# Altium footprint library 排针-排母-1.27.PcbLib: 152 footprints (part 10 of 10)
Each footprint in its own frame and in the unit in brackets; x right, y up, seen from the top. Pads: shape width x height; smd on the part's side, far side on the other; paste and mask are expansions set on the pad; w line width, h text height; cw(c..) or ccw(c..) is an arc to the next point about the centre after c.
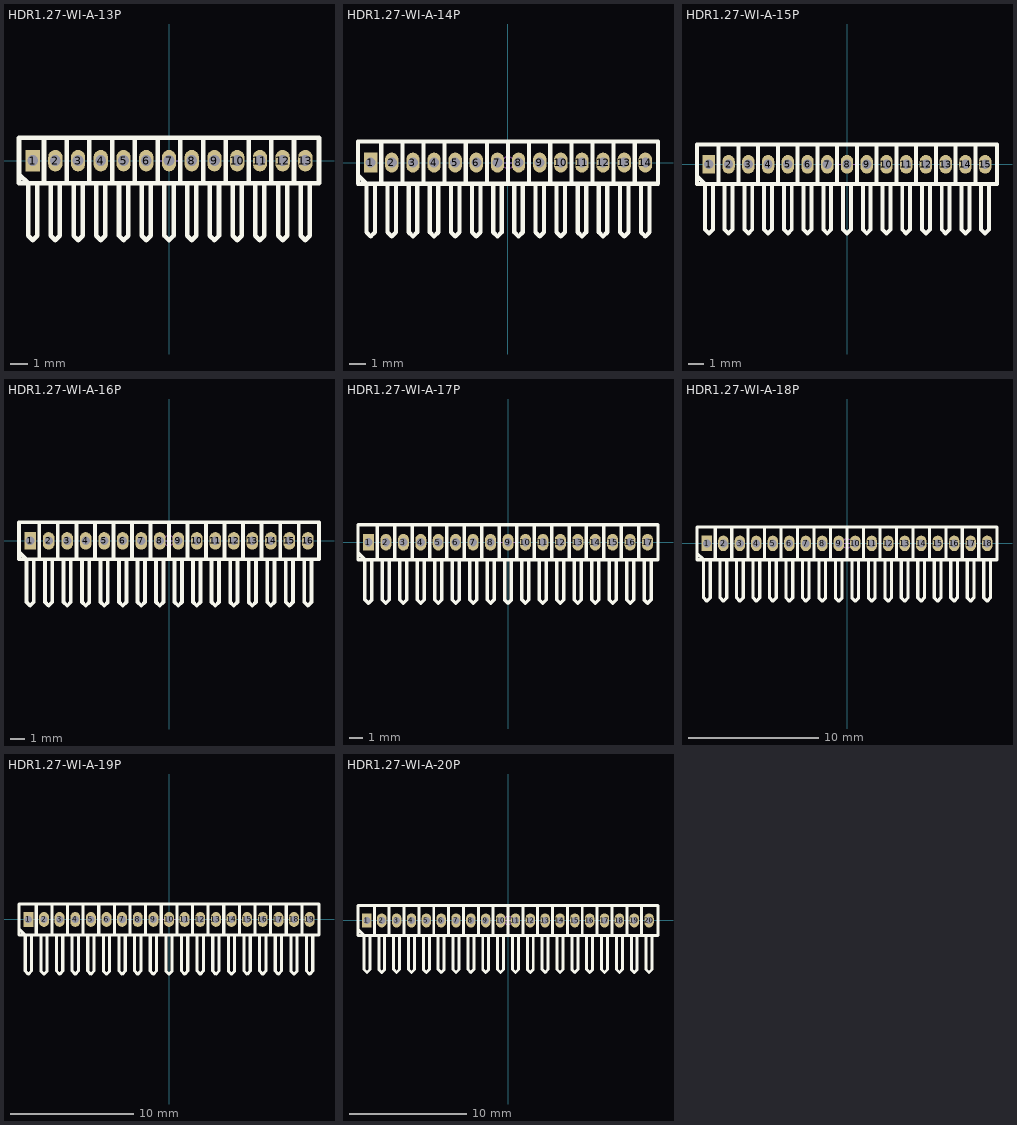
[diagram p9: the footprints below, top view; thin cyan lines are the x and y axes]

## HDR1.27-WI-A-13P [mm] "直插，脚距：1.27mm"
pads (13):
  rect 0.8x1.2 hole 0.6: 1(-7.62,0)
  oval 0.8x1.2 hole 0.6: 2(-6.35,0) 3(-5.08,0) 4(-3.81,0) 5(-2.54,0) 6(-1.27,0) 7(0,0) 8(1.27,0) 9(2.54,0) 10(3.81,0) 11(5.08,0) 12(6.35,0) 13(7.62,0)
Top Overlay:
  lines w0.254: -8.382,-0.762 -7.874,-1.27 ; -7.874,-1.397 -7.874,-4.191 -7.62,-4.445 -7.366,-4.191 -7.366,-1.27 ; -6.985,-1.27 -6.985,1.27 ; -6.604,-1.397 -6.604,-4.191 -6.35,-4.445 -6.096,-4.191 -6.096,-1.27 ; -5.715,-1.27 -5.715,1.2 ; -5.334,-1.397 -5.334,-4.191 -5.08,-4.445 -4.826,-4.191 -4.826,-1.27 ; -4.445,-1.2 -4.445,1.27 ; -4.064,-1.397 -4.064,-4.191 -3.81,-4.445 -3.556,-4.191 -3.556,-1.27 ; -3.175,1.27 -3.175,-1.235 ; -2.794,-1.397 -2.794,-4.191 -2.54,-4.445 -2.286,-4.191 -2.286,-1.27 ; -1.905,-1.235 -1.905,1.27 ; -1.524,-1.397 -1.524,-4.191 -1.27,-4.445 -1.016,-4.191 -1.016,-1.27 ; -0.635,-1.235 -0.635,1.27 ; -0.254,-1.397 -0.254,-4.191 0,-4.445 0.254,-4.191 0.254,-1.27 ; 0.635,-1.235 0.635,1.27 ; 1.016,-1.397 1.016,-4.191 1.27,-4.445 1.524,-4.191 1.524,-1.27 ; 1.905,-1.235 1.905,1.27 ; 2.286,-1.397 2.286,-4.191 2.54,-4.445 2.794,-4.191 2.794,-1.27 ; 3.175,-1.235 3.175,1.27 ; 3.556,-1.397 3.556,-4.191 3.81,-4.445 4.064,-4.191 4.064,-1.27 ; 4.445,-1.235 4.445,1.27 ; 4.826,-1.397 4.826,-4.191 5.08,-4.445 5.334,-4.191 5.334,-1.27 ; 5.715,-1.235 5.715,1.27 ; 6.096,-1.397 6.096,-4.191 6.35,-4.445 6.604,-4.191 6.604,-1.27 ; 6.985,-1.235 6.985,1.27 ; 7.366,-1.397 7.366,-4.191 7.62,-4.445 7.874,-4.191 7.874,-1.27 ; -3.175,-1.235 -3.175,-1.235 ; -8.382,-1.27 8.382,-1.27 8.382,1.27 -8.382,1.27 -8.382,-1.27
Mechanical 15:
  circle w0.05: c0,0 r0.35
  lines w0.05: -0.5,0 0.5,0 ; 0,-0.5 0,0.5
3D body: height 3.96, standoff -2.72, extent -8.255,-4.7 8.255,1.2

## HDR1.27-WI-A-14P [mm] "直插，脚距：1.27mm"
pads (14):
  rect 0.8x1.2 hole 0.6: 1(-8.255,0)
  oval 0.8x1.2 hole 0.6: 2(-6.985,0) 3(-5.715,0) 4(-4.445,0) 5(-3.175,0) 6(-1.905,0) 7(-0.635,0) 8(0.635,0) 9(1.905,0) 10(3.175,0) 11(4.445,0) 12(5.715,0) 13(6.985,0) 14(8.255,0)
Top Overlay:
  lines w0.254: -9.017,-0.762 -8.509,-1.27 ; -8.509,-1.397 -8.509,-4.191 -8.255,-4.445 -8.001,-4.191 -8.001,-1.27 ; -7.62,-1.27 -7.62,1.27 ; -7.239,-1.397 -7.239,-4.191 -6.985,-4.445 -6.731,-4.191 -6.731,-1.27 ; -6.35,-1.27 -6.35,1.2 ; -5.969,-1.397 -5.969,-4.191 -5.715,-4.445 -5.461,-4.191 -5.461,-1.27 ; -5.08,-1.2 -5.08,1.27 ; -4.699,-1.397 -4.699,-4.191 -4.445,-4.445 -4.191,-4.191 -4.191,-1.27 ; -3.81,1.27 -3.81,-1.235 ; -3.429,-1.397 -3.429,-4.191 -3.175,-4.445 -2.921,-4.191 -2.921,-1.27 ; -2.54,-1.235 -2.54,1.27 ; -2.159,-1.397 -2.159,-4.191 -1.905,-4.445 -1.651,-4.191 -1.651,-1.27 ; -1.27,-1.235 -1.27,1.27 ; -0.889,-1.397 -0.889,-4.191 -0.635,-4.445 -0.381,-4.191 -0.381,-1.27 ; 0,-1.235 0,1.27 ; 0.381,-1.397 0.381,-4.191 0.635,-4.445 0.889,-4.191 0.889,-1.27 ; 1.27,-1.235 1.27,1.27 ; 1.651,-1.397 1.651,-4.191 1.905,-4.445 2.159,-4.191 2.159,-1.27 ; 2.54,-1.235 2.54,1.27 ; 2.921,-1.397 2.921,-4.191 3.175,-4.445 3.429,-4.191 3.429,-1.27 ; 3.81,-1.235 3.81,1.27 ; 4.191,-1.397 4.191,-4.191 4.445,-4.445 4.699,-4.191 4.699,-1.27 ; 5.08,-1.235 5.08,1.27 ; 5.461,-1.397 5.461,-4.191 5.715,-4.445 5.969,-4.191 5.969,-1.27 ; 6.35,-1.235 6.35,1.27 ; 6.731,-1.397 6.731,-4.191 6.985,-4.445 7.239,-4.191 7.239,-1.27 ; 7.62,-1.235 7.62,1.27 ; 8.001,-1.397 8.001,-4.191 8.255,-4.445 8.509,-4.191 8.509,-1.27 ; -3.81,-1.235 -3.81,-1.235 ; -9.017,-1.27 -9.017,1.27 9.017,1.27 9.017,-1.27 -9.017,-1.27
Mechanical 15:
  circle w0.05: c0,0 r0.35
  lines w0.05: -0.5,0 0.5,0 ; 0,-0.5 0,0.5
3D body: height 3.96, standoff -2.72, extent -8.89,-4.7 8.89,1.2

## HDR1.27-WI-A-15P [mm] "直插，脚距：1.27mm"
pads (15):
  rect 0.8x1.2 hole 0.6: 1(-8.89,-0.017)
  oval 0.8x1.2 hole 0.6: 2(-7.62,-0.017) 3(-6.35,-0.017) 4(-5.08,-0.017) 5(-3.81,-0.017) 6(-2.54,-0.017) 7(-1.27,-0.017) 8(0,-0.017) 9(1.27,-0.017) 10(2.54,-0.017) 11(3.81,-0.017) 12(5.08,-0.017) 13(6.35,-0.017) 14(7.62,-0.017) 15(8.89,-0.017)
Top Overlay:
  lines w0.254: -9.652,-0.779 -9.144,-1.287 ; -9.144,-1.414 -9.144,-4.208 -8.89,-4.462 -8.636,-4.208 -8.636,-1.287 ; -8.255,-1.287 -8.255,1.253 ; -7.874,-1.414 -7.874,-4.208 -7.62,-4.462 -7.366,-4.208 -7.366,-1.287 ; -6.985,-1.287 -6.985,1.183 ; -6.604,-1.414 -6.604,-4.208 -6.35,-4.462 -6.096,-4.208 -6.096,-1.287 ; -5.715,-1.217 -5.715,1.253 ; -5.334,-1.414 -5.334,-4.208 -5.08,-4.462 -4.826,-4.208 -4.826,-1.287 ; -4.445,1.253 -4.445,-1.252 ; -4.064,-1.414 -4.064,-4.208 -3.81,-4.462 -3.556,-4.208 -3.556,-1.287 ; -3.175,-1.252 -3.175,1.253 ; -2.794,-1.414 -2.794,-4.208 -2.54,-4.462 -2.286,-4.208 -2.286,-1.287 ; -1.905,-1.252 -1.905,1.253 ; -1.524,-1.414 -1.524,-4.208 -1.27,-4.462 -1.016,-4.208 -1.016,-1.287 ; -0.635,-1.252 -0.635,1.253 ; -0.254,-1.414 -0.254,-4.208 0,-4.462 0.254,-4.208 0.254,-1.287 ; 0.635,-1.252 0.635,1.253 ; 1.016,-1.414 1.016,-4.208 1.27,-4.462 1.524,-4.208 1.524,-1.287 ; 1.905,-1.252 1.905,1.253 ; 2.286,-1.414 2.286,-4.208 2.54,-4.462 2.794,-4.208 2.794,-1.287 ; 3.175,-1.252 3.175,1.253 ; 3.556,-1.414 3.556,-4.208 3.81,-4.462 4.064,-4.208 4.064,-1.287 ; 4.445,-1.252 4.445,1.253 ; 4.826,-1.414 4.826,-4.208 5.08,-4.462 5.334,-4.208 5.334,-1.287 ; 5.715,-1.252 5.715,1.253 ; 6.096,-1.414 6.096,-4.208 6.35,-4.462 6.604,-4.208 6.604,-1.287 ; 6.985,-1.252 6.985,1.253 ; 7.366,-1.414 7.366,-4.208 7.62,-4.462 7.874,-4.208 7.874,-1.287 ; 8.255,-1.252 8.255,1.253 ; 8.636,-1.414 8.636,-4.208 8.89,-4.462 9.144,-4.208 9.144,-1.287 ; -4.445,-1.252 -4.445,-1.253 ; -9.652,-1.287 -9.652,1.253 9.652,1.253 9.652,-1.287 -9.652,-1.287
Mechanical 15:
  circle w0.05: c0,0 r0.35
  lines w0.05: -0.5,0 0.5,0 ; 0,-0.5 0,0.5
3D body: height 3.96, standoff -2.72, extent -9.525,-4.7 9.525,1.2

## HDR1.27-WI-A-16P [mm] "直插，脚距：1.27mm"
pads (16):
  rect 0.8x1.2 hole 0.6: 1(-9.525,-0.017)
  oval 0.8x1.2 hole 0.6: 2(-8.255,-0.017) 3(-6.985,-0.017) 4(-5.715,-0.017) 5(-4.445,-0.017) 6(-3.175,-0.017) 7(-1.905,-0.017) 8(-0.635,-0.017) 9(0.635,-0.017) 10(1.905,-0.017) 11(3.175,-0.017) 12(4.445,-0.017) 13(5.715,-0.017) 14(6.985,-0.017) 15(8.255,-0.017) 16(9.525,-0.017)
Top Overlay:
  lines w0.254: -10.287,-0.779 -9.779,-1.287 ; -9.779,-1.414 -9.779,-4.208 -9.525,-4.462 -9.271,-4.208 -9.271,-1.287 ; -8.89,-1.287 -8.89,1.253 ; -8.509,-1.414 -8.509,-4.208 -8.255,-4.462 -8.001,-4.208 -8.001,-1.287 ; -7.62,-1.287 -7.62,1.183 ; -7.239,-1.414 -7.239,-4.208 -6.985,-4.462 -6.731,-4.208 -6.731,-1.287 ; -6.35,-1.217 -6.35,1.253 ; -5.969,-1.414 -5.969,-4.208 -5.715,-4.462 -5.461,-4.208 -5.461,-1.287 ; -5.08,1.253 -5.08,-1.253 ; -4.699,-1.414 -4.699,-4.208 -4.445,-4.462 -4.191,-4.208 -4.191,-1.287 ; -3.81,-1.253 -3.81,1.253 ; -3.429,-1.414 -3.429,-4.208 -3.175,-4.462 -2.921,-4.208 -2.921,-1.287 ; -2.54,-1.253 -2.54,1.253 ; -2.159,-1.414 -2.159,-4.208 -1.905,-4.462 -1.651,-4.208 -1.651,-1.287 ; -1.27,-1.253 -1.27,1.253 ; -0.889,-1.414 -0.889,-4.208 -0.635,-4.462 -0.381,-4.208 -0.381,-1.287 ; 0,-1.253 0,1.253 ; 0.381,-1.414 0.381,-4.208 0.635,-4.462 0.889,-4.208 0.889,-1.287 ; 1.27,-1.253 1.27,1.253 ; 1.651,-1.414 1.651,-4.208 1.905,-4.462 2.159,-4.208 2.159,-1.287 ; 2.54,-1.253 2.54,1.253 ; 2.921,-1.414 2.921,-4.208 3.175,-4.462 3.429,-4.208 3.429,-1.287 ; 3.81,-1.253 3.81,1.253 ; 4.191,-1.414 4.191,-4.208 4.445,-4.462 4.699,-4.208 4.699,-1.287 ; 5.08,-1.253 5.08,1.253 ; 5.461,-1.414 5.461,-4.208 5.715,-4.462 5.969,-4.208 5.969,-1.287 ; 6.35,-1.253 6.35,1.253 ; 6.731,-1.414 6.731,-4.208 6.985,-4.462 7.239,-4.208 7.239,-1.287 ; 7.62,-1.253 7.62,1.253 ; 8.001,-1.414 8.001,-4.208 8.255,-4.462 8.509,-4.208 8.509,-1.287 ; 8.89,-1.253 8.89,1.253 ; 9.271,-1.414 9.271,-4.208 9.525,-4.462 9.779,-4.208 9.779,-1.287 ; -5.08,-1.253 -5.08,-1.253 ; -10.287,-1.287 -10.287,1.253 10.287,1.253 10.287,-1.287 -10.287,-1.287
Mechanical 15:
  circle w0.05: c0,0 r0.35
  lines w0.05: -0.5,0 0.5,0 ; 0,-0.5 0,0.5
3D body: height 3.96, standoff -2.72, extent -10.16,-4.7 10.16,1.2

## HDR1.27-WI-A-17P [mm] "直插，脚距：1.27mm"
pads (17):
  rect 0.8x1.2 hole 0.6: 1(-10.16,0)
  oval 0.8x1.2 hole 0.6: 2(-8.89,0) 3(-7.62,0) 4(-6.35,0) 5(-5.08,0) 6(-3.81,0) 7(-2.54,0) 8(-1.27,0) 9(0,0) 10(1.27,0) 11(2.54,0) 12(3.81,0) 13(5.08,0) 14(6.35,0) 15(7.62,0) 16(8.89,0) 17(10.16,0)
Top Overlay:
  lines w0.254: -10.922,-0.762 -10.414,-1.27 ; -10.414,-1.397 -10.414,-4.191 -10.16,-4.445 -9.906,-4.191 -9.906,-1.27 ; -9.525,-1.27 -9.525,1.27 ; -9.144,-1.397 -9.144,-4.191 -8.89,-4.445 -8.636,-4.191 -8.636,-1.27 ; -8.255,-1.27 -8.255,1.2 ; -7.874,-1.397 -7.874,-4.191 -7.62,-4.445 -7.366,-4.191 -7.366,-1.27 ; -6.985,-1.2 -6.985,1.27 ; -6.604,-1.397 -6.604,-4.191 -6.35,-4.445 -6.096,-4.191 -6.096,-1.27 ; -5.715,1.27 -5.715,-1.235 ; -5.334,-1.397 -5.334,-4.191 -5.08,-4.445 -4.826,-4.191 -4.826,-1.27 ; -4.445,-1.235 -4.445,1.27 ; -4.064,-1.397 -4.064,-4.191 -3.81,-4.445 -3.556,-4.191 -3.556,-1.27 ; -3.175,-1.235 -3.175,1.27 ; -2.794,-1.397 -2.794,-4.191 -2.54,-4.445 -2.286,-4.191 -2.286,-1.27 ; -1.905,-1.235 -1.905,1.27 ; -1.524,-1.397 -1.524,-4.191 -1.27,-4.445 -1.016,-4.191 -1.016,-1.27 ; -0.635,-1.235 -0.635,1.27 ; -0.254,-1.397 -0.254,-4.191 0,-4.445 0.254,-4.191 0.254,-1.27 ; 0.635,-1.235 0.635,1.27 ; 1.016,-1.397 1.016,-4.191 1.27,-4.445 1.524,-4.191 1.524,-1.27 ; 1.905,-1.235 1.905,1.27 ; 2.286,-1.397 2.286,-4.191 2.54,-4.445 2.794,-4.191 2.794,-1.27 ; 3.175,-1.235 3.175,1.27 ; 3.556,-1.397 3.556,-4.191 3.81,-4.445 4.064,-4.191 4.064,-1.27 ; 4.445,-1.235 4.445,1.27 ; 4.826,-1.397 4.826,-4.191 5.08,-4.445 5.334,-4.191 5.334,-1.27 ; 5.715,-1.235 5.715,1.27 ; 6.096,-1.397 6.096,-4.191 6.35,-4.445 6.604,-4.191 6.604,-1.27 ; 6.985,-1.235 6.985,1.27 ; 7.366,-1.397 7.366,-4.191 7.62,-4.445 7.874,-4.191 7.874,-1.27 ; 8.255,-1.235 8.255,1.27 ; 8.636,-1.397 8.636,-4.191 8.89,-4.445 9.144,-4.191 9.144,-1.27 ; 9.525,-1.235 9.525,1.27 ; 9.906,-1.397 9.906,-4.191 10.16,-4.445 10.414,-4.191 10.414,-1.27 ; -5.715,-1.235 -5.715,-1.235 ; -10.922,-1.27 -10.922,1.27 10.922,1.27 10.922,-1.27 -10.922,-1.27
Mechanical 15:
  circle w0.05: c0,0 r0.35
  lines w0.05: -0.5,0 0.5,0 ; 0,-0.5 0,0.5
3D body: height 3.96, standoff -2.72, extent -10.795,-4.7 10.795,1.2

## HDR1.27-WI-A-18P [mm] "直插，脚距：1.27mm"
pads (18):
  rect 0.8x1.2 hole 0.6: 1(-10.795,0)
  oval 0.8x1.2 hole 0.6: 2(-9.525,0) 3(-8.255,0) 4(-6.985,0) 5(-5.715,0) 6(-4.445,0) 7(-3.175,0) 8(-1.905,0) 9(-0.635,0) 10(0.635,0) 11(1.905,0) 12(3.175,0) 13(4.445,0) 14(5.715,0) 15(6.985,0) 16(8.255,0) 17(9.525,0) 18(10.795,0)
Top Overlay:
  lines w0.254: -11.557,-0.762 -11.049,-1.27 ; -11.049,-1.397 -11.049,-4.191 -10.795,-4.445 -10.541,-4.191 -10.541,-1.27 ; -10.16,-1.27 -10.16,1.27 ; -9.779,-1.397 -9.779,-4.191 -9.525,-4.445 -9.271,-4.191 -9.271,-1.27 ; -8.89,-1.27 -8.89,1.2 ; -8.509,-1.397 -8.509,-4.191 -8.255,-4.445 -8.001,-4.191 -8.001,-1.27 ; -7.62,-1.2 -7.62,1.27 ; -7.239,-1.397 -7.239,-4.191 -6.985,-4.445 -6.731,-4.191 -6.731,-1.27 ; -6.35,1.27 -6.35,-1.235 ; -5.969,-1.397 -5.969,-4.191 -5.715,-4.445 -5.461,-4.191 -5.461,-1.27 ; -5.08,-1.235 -5.08,1.27 ; -4.699,-1.397 -4.699,-4.191 -4.445,-4.445 -4.191,-4.191 -4.191,-1.27 ; -3.81,-1.235 -3.81,1.27 ; -3.429,-1.397 -3.429,-4.191 -3.175,-4.445 -2.921,-4.191 -2.921,-1.27 ; -2.54,-1.235 -2.54,1.27 ; -2.159,-1.397 -2.159,-4.191 -1.905,-4.445 -1.651,-4.191 -1.651,-1.27 ; -1.27,-1.235 -1.27,1.27 ; -0.889,-1.397 -0.889,-4.191 -0.635,-4.445 -0.381,-4.191 -0.381,-1.27 ; 0,-1.235 0,1.27 ; 0.381,-1.397 0.381,-4.191 0.635,-4.445 0.889,-4.191 0.889,-1.27 ; 1.27,-1.235 1.27,1.27 ; 1.651,-1.397 1.651,-4.191 1.905,-4.445 2.159,-4.191 2.159,-1.27 ; 2.54,-1.235 2.54,1.27 ; 2.921,-1.397 2.921,-4.191 3.175,-4.445 3.429,-4.191 3.429,-1.27 ; 3.81,-1.235 3.81,1.27 ; 4.191,-1.397 4.191,-4.191 4.445,-4.445 4.699,-4.191 4.699,-1.27 ; 5.08,-1.235 5.08,1.27 ; 5.461,-1.397 5.461,-4.191 5.715,-4.445 5.969,-4.191 5.969,-1.27 ; 6.35,-1.235 6.35,1.27 ; 6.731,-1.397 6.731,-4.191 6.985,-4.445 7.239,-4.191 7.239,-1.27 ; 7.62,-1.235 7.62,1.27 ; 8.001,-1.397 8.001,-4.191 8.255,-4.445 8.509,-4.191 8.509,-1.27 ; 8.89,-1.235 8.89,1.27 ; 9.271,-1.397 9.271,-4.191 9.525,-4.445 9.779,-4.191 9.779,-1.27 ; 10.16,-1.235 10.16,1.27 ; 10.541,-1.397 10.541,-4.191 10.795,-4.445 11.049,-4.191 11.049,-1.27 ; -6.35,-1.235 -6.35,-1.235 ; -11.557,-1.27 11.557,-1.27 11.557,1.27 -11.557,1.27 -11.557,-1.27
Mechanical 15:
  circle w0.05: c0,0 r0.35
  lines w0.05: -0.5,0 0.5,0 ; 0,-0.5 0,0.5
3D body: height 3.96, standoff -2.72, extent -11.43,-4.682 11.43,1.218

## HDR1.27-WI-A-19P [mm] "直插，脚距：1.27mm"
pads (19):
  rect 0.8x1.2 hole 0.6: 1(-11.43,0)
  oval 0.8x1.2 hole 0.6: 2(-10.16,0) 3(-8.89,0) 4(-7.62,0) 5(-6.35,0) 6(-5.08,0) 7(-3.81,0) 8(-2.54,0) 9(-1.27,0) 10(0,0) 11(1.27,0) 12(2.54,0) 13(3.81,0) 14(5.08,0) 15(6.35,0) 16(7.62,0) 17(8.89,0) 18(10.16,0) 19(11.43,0)
Top Overlay:
  lines w0.254: -12.192,-0.762 -11.684,-1.27 ; -11.684,-1.397 -11.684,-4.191 -11.43,-4.445 -11.176,-4.191 -11.176,-1.27 ; -10.795,-1.27 -10.795,1.27 ; -10.414,-1.397 -10.414,-4.191 -10.16,-4.445 -9.906,-4.191 -9.906,-1.27 ; -9.525,-1.27 -9.525,1.2 ; -9.144,-1.397 -9.144,-4.191 -8.89,-4.445 -8.636,-4.191 -8.636,-1.27 ; -8.255,-1.2 -8.255,1.27 ; -7.874,-1.397 -7.874,-4.191 -7.62,-4.445 -7.366,-4.191 -7.366,-1.27 ; -6.985,1.27 -6.985,-1.235 ; -6.604,-1.397 -6.604,-4.191 -6.35,-4.445 -6.096,-4.191 -6.096,-1.27 ; -5.715,-1.235 -5.715,1.27 ; -5.334,-1.397 -5.334,-4.191 -5.08,-4.445 -4.826,-4.191 -4.826,-1.27 ; -4.445,-1.235 -4.445,1.27 ; -4.064,-1.397 -4.064,-4.191 -3.81,-4.445 -3.556,-4.191 -3.556,-1.27 ; -3.175,-1.235 -3.175,1.27 ; -2.794,-1.397 -2.794,-4.191 -2.54,-4.445 -2.286,-4.191 -2.286,-1.27 ; -1.905,-1.235 -1.905,1.27 ; -1.524,-1.397 -1.524,-4.191 -1.27,-4.445 -1.016,-4.191 -1.016,-1.27 ; -0.635,-1.235 -0.635,1.27 ; -0.254,-1.397 -0.254,-4.191 0,-4.445 0.254,-4.191 0.254,-1.27 ; 0.635,-1.235 0.635,1.27 ; 1.016,-1.397 1.016,-4.191 1.27,-4.445 1.524,-4.191 1.524,-1.27 ; 1.905,-1.235 1.905,1.27 ; 2.286,-1.397 2.286,-4.191 2.54,-4.445 2.794,-4.191 2.794,-1.27 ; 3.175,-1.235 3.175,1.27 ; 3.556,-1.397 3.556,-4.191 3.81,-4.445 4.064,-4.191 4.064,-1.27 ; 4.445,-1.235 4.445,1.27 ; 4.826,-1.397 4.826,-4.191 5.08,-4.445 5.334,-4.191 5.334,-1.27 ; 5.715,-1.235 5.715,1.27 ; 6.096,-1.397 6.096,-4.191 6.35,-4.445 6.604,-4.191 6.604,-1.27 ; 6.985,-1.235 6.985,1.27 ; 7.366,-1.397 7.366,-4.191 7.62,-4.445 7.874,-4.191 7.874,-1.27 ; 8.255,-1.235 8.255,1.27 ; 8.636,-1.397 8.636,-4.191 8.89,-4.445 9.144,-4.191 9.144,-1.27 ; 9.525,-1.235 9.525,1.27 ; 9.906,-1.397 9.906,-4.191 10.16,-4.445 10.414,-4.191 10.414,-1.27 ; 10.795,-1.235 10.795,1.27 ; 11.176,-1.397 11.176,-4.191 11.43,-4.445 11.684,-4.191 11.684,-1.27 ; -6.985,-1.235 -6.985,-1.235 ; -12.192,-1.27 12.192,-1.27 12.192,1.27 -12.192,1.27 -12.192,-1.27
Mechanical 15:
  circle w0.05: c0,0 r0.35
  lines w0.05: -0.5,0 0.5,0 ; 0,-0.5 0,0.5
3D body: height 3.96, standoff -2.72, extent -12.065,-4.7 12.065,1.2

## HDR1.27-WI-A-20P [mm] "直插，脚距：1.27mm"
pads (20):
  rect 0.8x1.2 hole 0.6: 1(-12.065,0)
  oval 0.8x1.2 hole 0.6: 2(-10.795,0) 3(-9.525,0) 4(-8.255,0) 5(-6.985,0) 6(-5.715,0) 7(-4.445,0) 8(-3.175,0) 9(-1.905,0) 10(-0.635,0) 11(0.635,0) 12(1.905,0) 13(3.175,0) 14(4.445,0) 15(5.715,0) 16(6.985,0) 17(8.255,0) 18(9.525,0) 19(10.795,0) 20(12.065,0)
Top Overlay:
  lines w0.254: -12.827,-0.762 -12.319,-1.27 ; -12.319,-1.397 -12.319,-4.191 -12.065,-4.445 -11.811,-4.191 -11.811,-1.27 ; -11.43,-1.27 -11.43,1.27 ; -11.049,-1.397 -11.049,-4.191 -10.795,-4.445 -10.541,-4.191 -10.541,-1.27 ; -10.16,-1.27 -10.16,1.2 ; -9.779,-1.397 -9.779,-4.191 -9.525,-4.445 -9.271,-4.191 -9.271,-1.27 ; -8.89,-1.2 -8.89,1.27 ; -8.509,-1.397 -8.509,-4.191 -8.255,-4.445 -8.001,-4.191 -8.001,-1.27 ; -7.62,1.27 -7.62,-1.235 ; -7.239,-1.397 -7.239,-4.191 -6.985,-4.445 -6.731,-4.191 -6.731,-1.27 ; -6.35,-1.235 -6.35,1.27 ; -5.969,-1.397 -5.969,-4.191 -5.715,-4.445 -5.461,-4.191 -5.461,-1.27 ; -5.08,-1.235 -5.08,1.27 ; -4.699,-1.397 -4.699,-4.191 -4.445,-4.445 -4.191,-4.191 -4.191,-1.27 ; -3.81,-1.235 -3.81,1.27 ; -3.429,-1.397 -3.429,-4.191 -3.175,-4.445 -2.921,-4.191 -2.921,-1.27 ; -2.54,-1.235 -2.54,1.27 ; -2.159,-1.397 -2.159,-4.191 -1.905,-4.445 -1.651,-4.191 -1.651,-1.27 ; -1.27,-1.235 -1.27,1.27 ; -0.889,-1.397 -0.889,-4.191 -0.635,-4.445 -0.381,-4.191 -0.381,-1.27 ; 0,-1.235 0,1.27 ; 0.381,-1.397 0.381,-4.191 0.635,-4.445 0.889,-4.191 0.889,-1.27 ; 1.27,-1.235 1.27,1.27 ; 1.651,-1.397 1.651,-4.191 1.905,-4.445 2.159,-4.191 2.159,-1.27 ; 2.54,-1.235 2.54,1.27 ; 2.921,-1.397 2.921,-4.191 3.175,-4.445 3.429,-4.191 3.429,-1.27 ; 3.81,-1.235 3.81,1.27 ; 4.191,-1.397 4.191,-4.191 4.445,-4.445 4.699,-4.191 4.699,-1.27 ; 5.08,-1.235 5.08,1.27 ; 5.461,-1.397 5.461,-4.191 5.715,-4.445 5.969,-4.191 5.969,-1.27 ; 6.35,-1.235 6.35,1.27 ; 6.731,-1.397 6.731,-4.191 6.985,-4.445 7.239,-4.191 7.239,-1.27 ; 7.62,-1.235 7.62,1.27 ; 8.001,-1.397 8.001,-4.191 8.255,-4.445 8.509,-4.191 8.509,-1.27 ; 8.89,-1.235 8.89,1.27 ; 9.271,-1.397 9.271,-4.191 9.525,-4.445 9.779,-4.191 9.779,-1.27 ; 10.16,-1.235 10.16,1.27 ; 10.541,-1.397 10.541,-4.191 10.795,-4.445 11.049,-4.191 11.049,-1.27 ; 11.43,-1.235 11.43,1.27 ; 11.811,-1.397 11.811,-4.191 12.065,-4.445 12.319,-4.191 12.319,-1.27 ; -7.62,-1.235 -7.62,-1.235 ; -12.827,-1.27 12.827,-1.27 12.827,1.27 -12.827,1.27 -12.827,-1.27
Mechanical 15:
  circle w0.05: c0,0 r0.35
  lines w0.05: -0.5,0 0.5,0 ; 0,-0.5 0,0.5
3D body: height 3.96, standoff -2.72, extent -12.7,-4.682 12.7,1.218